# Altium footprint library Modules_LT.PcbLib: 4 footprints
Each footprint in its own frame and in the unit in brackets; x right, y up, seen from the top. Pads: shape width x height; smd on the part's side, far side on the other; paste and mask are expansions set on the pad; w line width, h text height; cw(c..) or ccw(c..) is an arc to the next point about the centre after c.
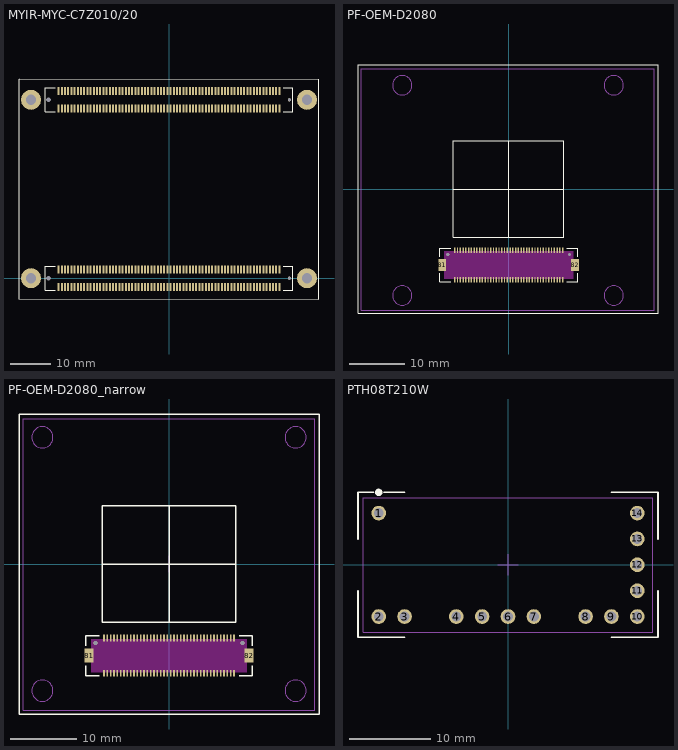
[diagram p0: the footprints below, top view; thin cyan lines are the x and y axes]

## MYIR-MYC-C7Z010/20 [mm] "Module, SMD, MYIR MYC-C7Z010/20"
height 8
pads (288):
  rect 0.5x2 smd: J1_1(27.6,42.4) J1_2(27.6,46.8) J1_3(26.8,42.4) J1_4(26.8,46.8) J1_5(26,42.4) J1_6(26,46.8) J1_7(25.2,42.4) J1_8(25.2,46.8) J1_9(24.4,42.4) J1_10(24.4,46.8) J1_11(23.6,42.4) J1_12(23.6,46.8) J1_13(22.8,42.4) J1_14(22.8,46.8) J1_15(22,42.4) J1_16(22,46.8) J1_17(21.2,42.4) J1_18(21.2,46.8) J1_19(20.4,42.4) J1_20(20.4,46.8) J1_21(19.6,42.4) J1_22(19.6,46.8) J1_23(18.8,42.4) J1_24(18.8,46.8) J1_25(18,42.4) J1_26(18,46.8) J1_27(17.2,42.4) J1_28(17.2,46.8) J1_29(16.4,42.4) J1_30(16.4,46.8) J1_31(15.6,42.4) J1_32(15.6,46.8) J1_33(14.8,42.4) J1_34(14.8,46.8) J1_35(14,42.4) J1_36(14,46.8) J1_37(13.2,42.4) J1_38(13.2,46.8) J1_39(12.4,42.4) J1_40(12.4,46.8) J1_41(11.6,42.4) J1_42(11.6,46.8) J1_43(10.8,42.4) J1_44(10.8,46.8) J1_45(10,42.4) J1_46(10,46.8) J1_47(9.2,42.4) J1_48(9.2,46.8) J1_49(8.4,42.4) J1_50(8.4,46.8) J1_51(7.6,42.4) J1_52(7.6,46.8) J1_53(6.8,42.4) J1_54(6.8,46.8) J1_55(6,42.4) J1_56(6,46.8) J1_57(5.2,42.4) J1_58(5.2,46.8) J1_59(4.4,42.4) J1_60(4.4,46.8) J1_61(3.6,42.4) J1_62(3.6,46.8) J1_63(2.8,42.4) J1_64(2.8,46.8) J1_65(2,42.4) J1_66(2,46.8) J1_67(1.2,42.4) J1_68(1.2,46.8) J1_69(0.4,42.4) J1_70(0.4,46.8) J1_71(-0.4,42.4) J1_72(-0.4,46.8) J1_73(-1.2,42.4) J1_74(-1.2,46.8) J1_75(-2,42.4) J1_76(-2,46.8) J1_77(-2.8,42.4) J1_78(-2.8,46.8) J1_79(-3.6,42.4) J1_80(-3.6,46.8) J1_81(-4.4,42.4) J1_82(-4.4,46.8) J1_83(-5.2,42.4) J1_84(-5.2,46.8) J1_85(-6,42.4) J1_86(-6,46.8) J1_87(-6.8,42.4) J1_88(-6.8,46.8) J1_89(-7.6,42.4) J1_90(-7.6,46.8) J1_91(-8.4,42.4) J1_92(-8.4,46.8) J1_93(-9.2,42.4) J1_94(-9.2,46.8) J1_95(-10,42.4) J1_96(-10,46.8) J1_97(-10.8,42.4) J1_98(-10.8,46.8) J1_99(-11.6,42.4) J1_100(-11.6,46.8) J1_101(-12.4,42.4) J1_102(-12.4,46.8) J1_103(-13.2,42.4) J1_104(-13.2,46.8) J1_105(-14,42.4) J1_106(-14,46.8) J1_107(-14.8,42.4) J1_108(-14.8,46.8) J1_109(-15.6,42.4) J1_110(-15.6,46.8) J1_111(-16.4,42.4) J1_112(-16.4,46.8) J1_113(-17.2,42.4) J1_114(-17.2,46.8) J1_115(-18,42.4) J1_116(-18,46.8) J1_117(-18.8,42.4) J1_118(-18.8,46.8) J1_119(-19.6,42.4) J1_120(-19.6,46.8) J1_121(-20.4,42.4) J1_122(-20.4,46.8) J1_123(-21.2,42.4) J1_124(-21.2,46.8) J1_125(-22,42.4) J1_126(-22,46.8) J1_127(-22.8,42.4) J1_128(-22.8,46.8) J1_129(-23.6,42.4) J1_130(-23.6,46.8) J1_131(-24.4,42.4) J1_132(-24.4,46.8) J1_133(-25.2,42.4) J1_134(-25.2,46.8) J1_135(-26,42.4) J1_136(-26,46.8) J1_137(-26.8,42.4) J1_138(-26.8,46.8) J1_139(-27.6,42.4) J1_140(-27.6,46.8) J2_1(27.6,-2.2) J2_2(27.6,2.2) J2_3(26.8,-2.2) J2_4(26.8,2.2) J2_5(26,-2.2) J2_6(26,2.2) J2_7(25.2,-2.2) J2_8(25.2,2.2) J2_9(24.4,-2.2) J2_10(24.4,2.2) J2_11(23.6,-2.2) J2_12(23.6,2.2) J2_13(22.8,-2.2) J2_14(22.8,2.2) J2_15(22,-2.2) J2_16(22,2.2) J2_17(21.2,-2.2) J2_18(21.2,2.2) J2_19(20.4,-2.2) J2_20(20.4,2.2) J2_21(19.6,-2.2) J2_22(19.6,2.2) J2_23(18.8,-2.2) J2_24(18.8,2.2) J2_25(18,-2.2) J2_26(18,2.2) J2_27(17.2,-2.2) J2_28(17.2,2.2) J2_29(16.4,-2.2) J2_30(16.4,2.2) J2_31(15.6,-2.2) J2_32(15.6,2.2) J2_33(14.8,-2.2) J2_34(14.8,2.2) J2_35(14,-2.2) J2_36(14,2.2) J2_37(13.2,-2.2) J2_38(13.2,2.2) J2_39(12.4,-2.2) J2_40(12.4,2.2) J2_41(11.6,-2.2) J2_42(11.6,2.2) J2_43(10.8,-2.2) J2_44(10.8,2.2) J2_45(10,-2.2) J2_46(10,2.2) J2_47(9.2,-2.2) J2_48(9.2,2.2) J2_49(8.4,-2.2) J2_50(8.4,2.2) J2_51(7.6,-2.2) J2_52(7.6,2.2) J2_53(6.8,-2.2) J2_54(6.8,2.2) J2_55(6,-2.2) J2_56(6,2.2) J2_57(5.2,-2.2) J2_58(5.2,2.2) J2_59(4.4,-2.2) J2_60(4.4,2.2) J2_61(3.6,-2.2) J2_62(3.6,2.2) J2_63(2.8,-2.2) J2_64(2.8,2.2) J2_65(2,-2.2) J2_66(2,2.2) J2_67(1.2,-2.2) J2_68(1.2,2.2) J2_69(0.4,-2.2) J2_70(0.4,2.2) J2_71(-0.4,-2.2) J2_72(-0.4,2.2) J2_73(-1.2,-2.2) J2_74(-1.2,2.2) J2_75(-2,-2.2) J2_76(-2,2.2) J2_77(-2.8,-2.2) J2_78(-2.8,2.2) J2_79(-3.6,-2.2) J2_80(-3.6,2.2) J2_81(-4.4,-2.2) J2_82(-4.4,2.2) J2_83(-5.2,-2.2) J2_84(-5.2,2.2) J2_85(-6,-2.2) J2_86(-6,2.2) J2_87(-6.8,-2.2) J2_88(-6.8,2.2) J2_89(-7.6,-2.2) J2_90(-7.6,2.2) J2_91(-8.4,-2.2) J2_92(-8.4,2.2) J2_93(-9.2,-2.2) J2_94(-9.2,2.2) J2_95(-10,-2.2) J2_96(-10,2.2) J2_97(-10.8,-2.2) J2_98(-10.8,2.2) J2_99(-11.6,-2.2) J2_100(-11.6,2.2) J2_101(-12.4,-2.2) J2_102(-12.4,2.2) J2_103(-13.2,-2.2) J2_104(-13.2,2.2) J2_105(-14,-2.2) J2_106(-14,2.2) J2_107(-14.8,-2.2) J2_108(-14.8,2.2) J2_109(-15.6,-2.2) J2_110(-15.6,2.2) J2_111(-16.4,-2.2) J2_112(-16.4,2.2) J2_113(-17.2,-2.2) J2_114(-17.2,2.2) J2_115(-18,-2.2) J2_116(-18,2.2) J2_117(-18.8,-2.2) J2_118(-18.8,2.2) J2_119(-19.6,-2.2) J2_120(-19.6,2.2) J2_121(-20.4,-2.2) J2_122(-20.4,2.2) J2_123(-21.2,-2.2) J2_124(-21.2,2.2) J2_125(-22,-2.2) J2_126(-22,2.2) J2_127(-22.8,-2.2) J2_128(-22.8,2.2) J2_129(-23.6,-2.2) J2_130(-23.6,2.2) J2_131(-24.4,-2.2) J2_132(-24.4,2.2) J2_133(-25.2,-2.2) J2_134(-25.2,2.2) J2_135(-26,-2.2) J2_136(-26,2.2) J2_137(-26.8,-2.2) J2_138(-26.8,2.2) J2_139(-27.6,-2.2) J2_140(-27.6,2.2)
  round 5 hole 2.54: ""(-34.5,0) ""(-34.5,44.6) ""(34.5,0) ""(34.5,44.6)
  round 0.8 hole 1.2: ""(-30.1,0) ""(-30.1,44.6)
  round 0.8 hole 0.8: ""(30.1,0) ""(30.1,44.6)
Top Overlay:
  lines w0.2: -28.5,-3 -30.9,-3 -30.9,3 ; -28.5,3 -30.9,3 ; -28.5,41.6 -30.9,41.6 -30.9,47.6 ; -28.5,47.6 -30.9,47.6 ; 28.5,-3 30.9,-3 ; 28.5,3 30.9,3 30.9,-3 ; 28.5,41.6 30.9,41.6 ; 28.5,47.6 30.9,47.6 30.9,41.6 ; -30.9,3 -30.9,3 ; -30.9,47.6 -30.9,47.6 ; 30.9,-3 30.9,-3 ; 30.9,41.6 30.9,41.6 ; -37.5,-5.199 37.5,-5.2 37.5,49.8 -37.5,49.801 -37.5,-5.2
3D body "c-5177984-6-a-3d.stp": height 4.6, standoff -0.5, extent -30.9,-3 30.9,3
3D body "c-5177984-6-a-3d.stp": height 4.6, standoff -0.5, extent -30.9,41.6 30.9,47.6

## PF-OEM-D2080 [mm] "Receptable, SMD, 80 Pin, Pitch 0.5, PhotonFocus DF17(XX)-80DS-0.5V(XX)"
height 4
pads (82):
  rect 0.25x1 smd: 1(-9.75,-11.1) 2(-9.75,-16.4) 3(-9.25,-11.1) 4(-9.25,-16.4) 5(-8.75,-11.1) 6(-8.75,-16.4) 7(-8.25,-11.1) 8(-8.25,-16.4) 9(-7.75,-11.1) 10(-7.75,-16.4) 11(-7.25,-11.1) 12(-7.25,-16.4) 13(-6.75,-11.1) 14(-6.75,-16.4) 15(-6.25,-11.1) 16(-6.25,-16.4) 17(-5.75,-11.1) 18(-5.75,-16.4) 19(-5.25,-11.1) 20(-5.25,-16.4) 21(-4.75,-11.1) 22(-4.75,-16.4) 23(-4.25,-11.1) 24(-4.25,-16.4) 25(-3.75,-11.1) 26(-3.75,-16.4) 27(-3.25,-11.1) 28(-3.25,-16.4) 29(-2.75,-11.1) 30(-2.75,-16.4) 31(-2.25,-11.1) 32(-2.25,-16.4) 33(-1.75,-11.1) 34(-1.75,-16.4) 35(-1.25,-11.1) 36(-1.25,-16.4) 37(-0.75,-11.1) 38(-0.75,-16.4) 39(-0.25,-11.1) 40(-0.25,-16.4) 41(0.25,-11.1) 42(0.25,-16.4) 43(0.75,-11.1) 44(0.75,-16.4) 45(1.25,-11.1) 46(1.25,-16.4) 47(1.75,-11.1) 48(1.75,-16.4) 49(2.25,-11.1) 50(2.25,-16.4) 51(2.75,-11.1) 52(2.75,-16.4) 53(3.25,-11.1) 54(3.25,-16.4) 55(3.75,-11.1) 56(3.75,-16.4) 57(4.25,-11.1) 58(4.25,-16.4) 59(4.75,-11.1) 60(4.75,-16.4) 61(5.25,-11.1) 62(5.25,-16.4) 63(5.75,-11.1) 64(5.75,-16.4) 65(6.25,-11.1) 66(6.25,-16.4) 67(6.75,-11.1) 68(6.75,-16.4) 69(7.25,-11.1) 70(7.25,-16.4) 71(7.75,-11.1) 72(7.75,-16.4) 73(8.25,-11.1) 74(8.25,-16.4) 75(8.75,-11.1) 76(8.75,-16.4) 77(9.25,-11.1) 78(9.25,-16.4) 79(9.75,-11.1) 80(9.75,-16.4)
  rect 1.4x2.1 smd: 81(-12,-13.75) 82(12,-13.75)
via -11,-11.85 diameter 0.6 hole 0.6
via 11,-11.85 diameter 0.6 hole 0.6
Top Overlay:
  lines w0.2: -12.5,-15.25 -12.5,-16.75 -11.625,-16.75 -10.875,-16.75 -10.5,-16.75 ; -12.5,-12.25 -12.5,-10.75 -10.5,-10.75 ; -10,0 10,0 ; 0,-8.75 0,8.75 ; 10.5,-16.75 12.5,-16.75 12.5,-15.25 ; 10.5,-10.75 12.5,-10.75 12.5,-12.25 ; -27.25,-22.5 -27.25,22.5 27,22.5 27,-22.5 -27.25,-22.5 ; -10,-8.75 -10,8.75 10,8.75 10,-8.75 -10,-8.75
Top Solder keep-out:
  region: 11.7,-11.25 -11.7,-11.25 -11.7,-16.25 11.7,-16.25
Mechanical 13:
  circle w0.1: c-19.25,-19.25 r1.75
  circle w0.1: c19,-19.25 r1.75
  circle w0.1: c19,18.75 r1.75
  circle w0.1: c-19.25,18.75 r1.75
  lines w0.1: -26.664,-21.959 -26.664,21.754 26.365,21.754 26.365,-21.959 -26.664,-21.959
Mechanical 15:
  lines w0.1: -1.25,0 1.25,0 ; 0,-1.25 0,1.25
3D body "DF17(4_0)-80DS-0_5V.stp": height 4.5, standoff -0.6, extent -12.5,-16.6 12.5,-10.9
3D body "OEM-D2080-160-LC-12.STEP": height 22.09, standoff 2.4, extent -26.664,-21.959 26.365,21.754

## PF-OEM-D2080_narrow [mm] "Receptable, SMD, 80 Pin, Pitch 0.5, PhotonFocus DF17(XX)-80DS-0.5V(XX)"
height 4
pads (82):
  rect 0.25x1 smd: 1(-9.75,-11.1) 2(-9.75,-16.4) 3(-9.25,-11.1) 4(-9.25,-16.4) 5(-8.75,-11.1) 6(-8.75,-16.4) 7(-8.25,-11.1) 8(-8.25,-16.4) 9(-7.75,-11.1) 10(-7.75,-16.4) 11(-7.25,-11.1) 12(-7.25,-16.4) 13(-6.75,-11.1) 14(-6.75,-16.4) 15(-6.25,-11.1) 16(-6.25,-16.4) 17(-5.75,-11.1) 18(-5.75,-16.4) 19(-5.25,-11.1) 20(-5.25,-16.4) 21(-4.75,-11.1) 22(-4.75,-16.4) 23(-4.25,-11.1) 24(-4.25,-16.4) 25(-3.75,-11.1) 26(-3.75,-16.4) 27(-3.25,-11.1) 28(-3.25,-16.4) 29(-2.75,-11.1) 30(-2.75,-16.4) 31(-2.25,-11.1) 32(-2.25,-16.4) 33(-1.75,-11.1) 34(-1.75,-16.4) 35(-1.25,-11.1) 36(-1.25,-16.4) 37(-0.75,-11.1) 38(-0.75,-16.4) 39(-0.25,-11.1) 40(-0.25,-16.4) 41(0.25,-11.1) 42(0.25,-16.4) 43(0.75,-11.1) 44(0.75,-16.4) 45(1.25,-11.1) 46(1.25,-16.4) 47(1.75,-11.1) 48(1.75,-16.4) 49(2.25,-11.1) 50(2.25,-16.4) 51(2.75,-11.1) 52(2.75,-16.4) 53(3.25,-11.1) 54(3.25,-16.4) 55(3.75,-11.1) 56(3.75,-16.4) 57(4.25,-11.1) 58(4.25,-16.4) 59(4.75,-11.1) 60(4.75,-16.4) 61(5.25,-11.1) 62(5.25,-16.4) 63(5.75,-11.1) 64(5.75,-16.4) 65(6.25,-11.1) 66(6.25,-16.4) 67(6.75,-11.1) 68(6.75,-16.4) 69(7.25,-11.1) 70(7.25,-16.4) 71(7.75,-11.1) 72(7.75,-16.4) 73(8.25,-11.1) 74(8.25,-16.4) 75(8.75,-11.1) 76(8.75,-16.4) 77(9.25,-11.1) 78(9.25,-16.4) 79(9.75,-11.1) 80(9.75,-16.4)
  rect 1.4x2.1 smd: 81(-12,-13.75) 82(12,-13.75)
via 11,-11.85 diameter 0.6 hole 0.6
via -11,-11.85 diameter 0.6 hole 0.6
Top Overlay:
  lines w0.2: -12.5,-15.25 -12.5,-16.75 -11.625,-16.75 -10.875,-16.75 -10.5,-16.75 ; -12.5,-12.25 -12.5,-10.75 -10.5,-10.75 ; -10,0 10,0 ; 0,-8.75 0,8.75 ; 10.5,-16.75 12.5,-16.75 12.5,-15.25 ; 10.5,-10.75 12.5,-10.75 12.5,-12.25 ; -22.5,-22.5 22.5,-22.5 22.5,22.5 -22.5,22.5 -22.5,-22.5 ; -10,-8.75 10,-8.75 10,8.75 -10,8.75 -10,-8.75
Top Solder keep-out:
  region: 11.7,-11.25 -11.7,-11.25 -11.7,-16.25 11.7,-16.25
Mechanical 13:
  circle w0.1: c-19,19 r1.6
  circle w0.1: c19,19 r1.6
  circle w0.1: c19,-19 r1.6
  circle w0.1: c-19,-19 r1.6
  lines w0.1: -21.9,-21.959 21.9,-21.959 21.9,21.754 -21.9,21.754 -21.9,-21.959
Mechanical 15:
  lines w0.1: -1.25,0 1.25,0 ; 0,-1.25 0,1.25
3D body "DF17(4_0)-80DS-0_5V.stp": height 4.5, standoff -0.6, extent -12.5,-16.6 12.5,-10.9
3D body "phf_kamera_asm.stp": height 18.4, standoff 1.7, extent -21.834,-21.9 21.873,21.806

## PTH08T210W [mm]
height 8.509
pads (14):
  round 1.8 hole 1.2: 1(-15.875,6.35) 2(-15.875,-6.35) 3(-12.7,-6.35) 4(-6.35,-6.35) 5(-3.175,-6.35) 6(0,-6.35) 7(3.175,-6.35) 8(9.525,-6.35) 9(12.7,-6.35) 10(15.875,-6.35) 11(15.875,-3.175) 12(15.875,0) 13(15.875,3.175) 14(15.875,6.35)
Top Overlay:
  circle w0.5: c-15.875,8.89 r0.2
  lines w0.2: -18.415,-3.175 -18.415,-8.89 -12.7,-8.89 ; -18.415,3.175 -18.415,8.89 -16.51,8.89 ; -15.24,8.89 -12.7,8.89 ; 12.7,-8.89 18.415,-8.89 18.415,-3.175 ; 12.7,8.89 18.415,8.89 18.415,3.175
Mechanical 15:
  lines w0.05: -17.78,-8.255 -17.78,8.255 17.78,8.255 17.78,-8.255 -17.78,-8.255
  lines w0.1: -1.27,0 1.27,0 ; 0,-1.27 0,1.27
3D body: height 8.51, standoff 0, extent -17.78,-8.255 17.78,8.255